# Altium schematic symbol library IC_TI.SCHLIB: 1162 symbols (part 8 of 8) (continued)
## TS3A44159PWR (continued)
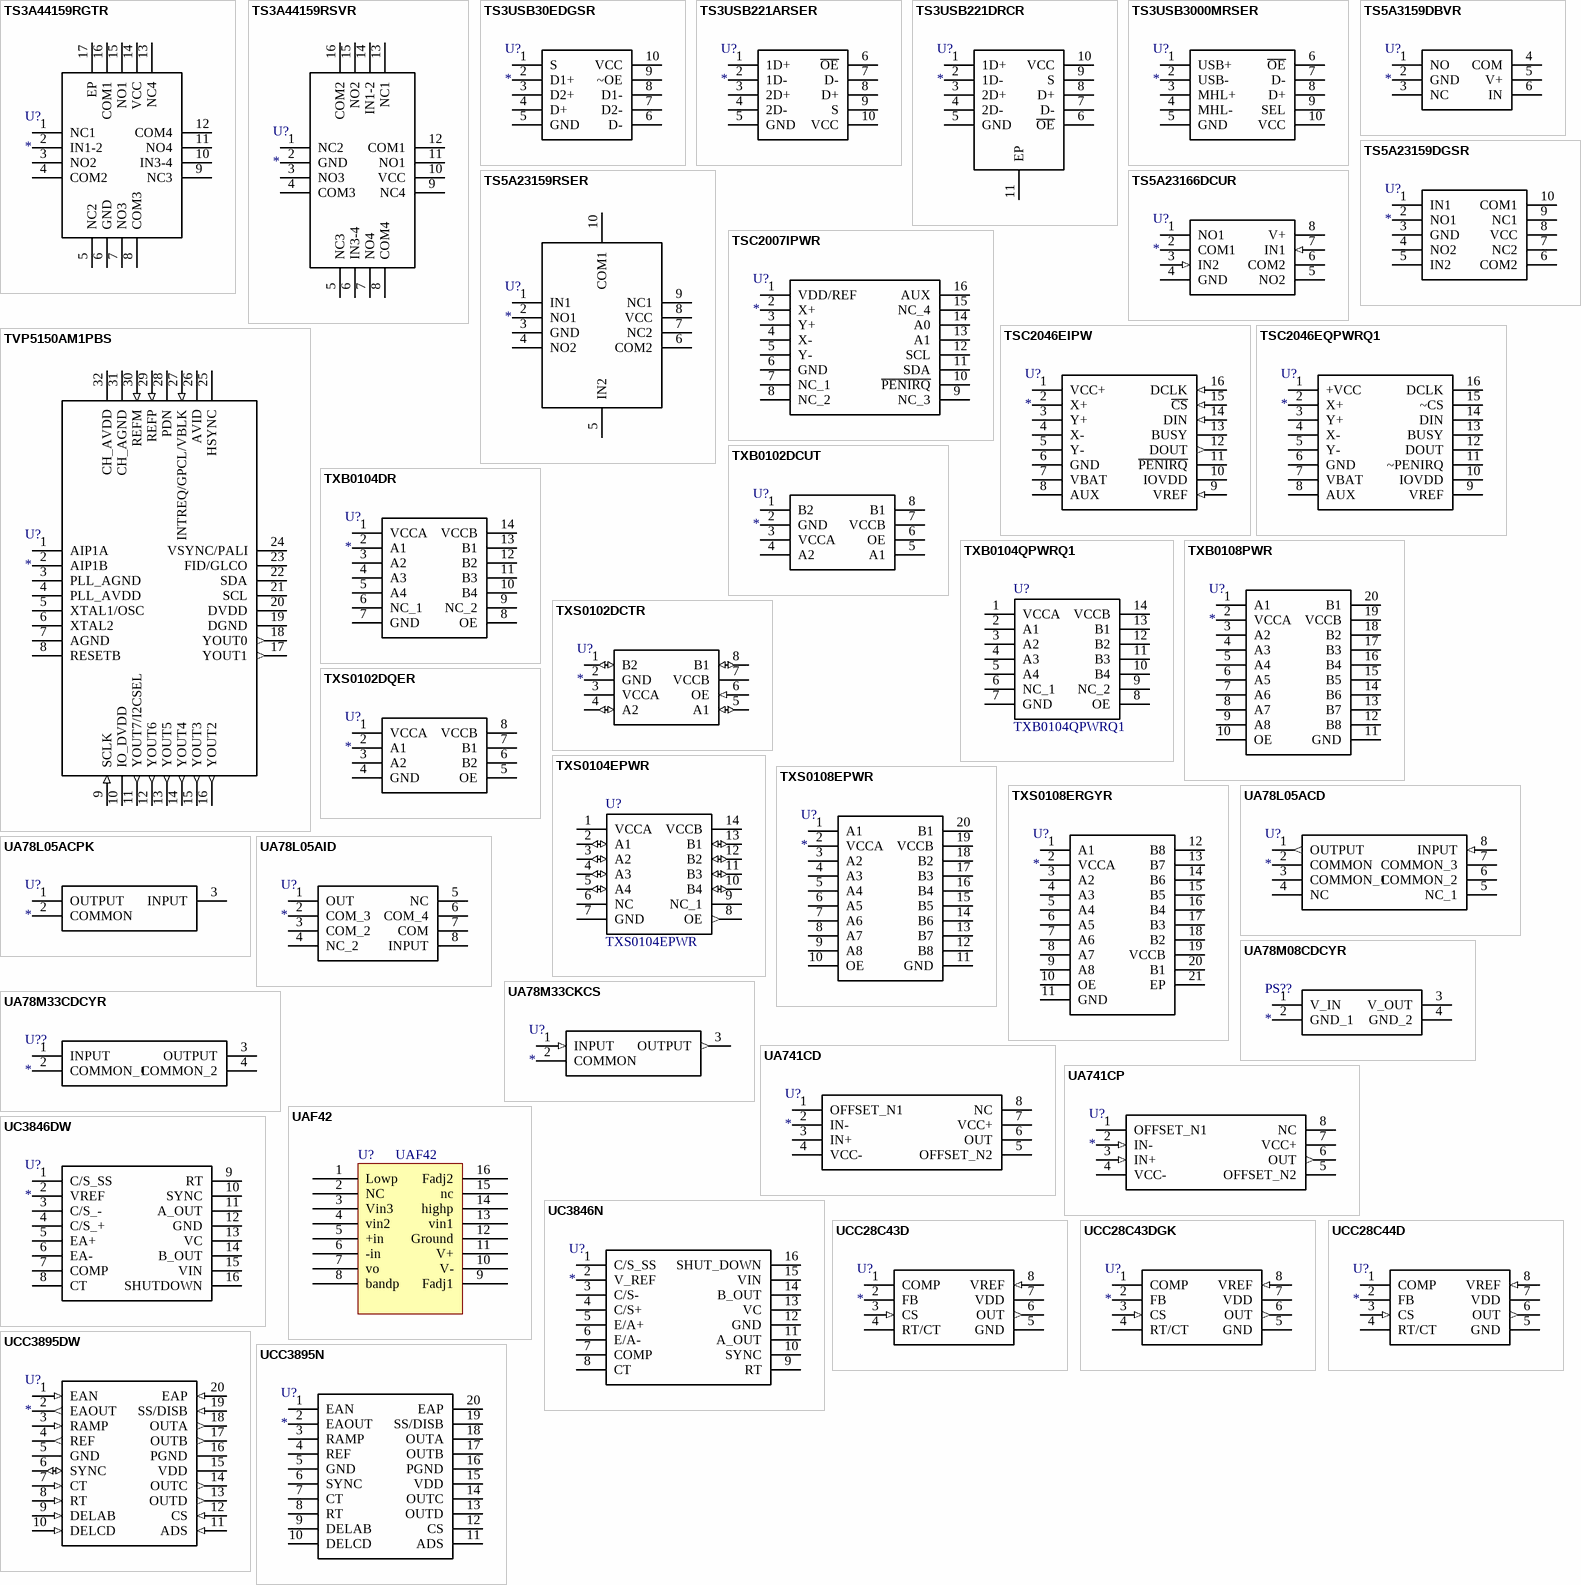
[diagram p34: symbols TS3A44159RGTR to UCC3895N]

## TS3A44159RGTR
designator U?
Integrated Circuit; Manufacturer_Name: Texas Instruments; Manufacturer_Part_Number: TS3A44159RGTR; Datasheet Link: http://www.ti.com/lit/gpn/ts3a44159; Height: 1mm; Mouser Part Number: 595-TS3A44159RGTR; Mouser Price/Stock: https://www.mouser.com/Search/Refine.aspx?Keyword=595-TS3A44159RGTR; RS Part Number: 8255387P; RS Price/Stock: http://uk.rs-online.com/web/p/products/8255387P
footprint QFN16_0.5-PAD(3X3) (QFN, 16-Leads, Body 3.0x3.0mm (max), Pitch 0.50mm, IPC Low Density)
pins: 1 NC1, 2 IN1-2, 3 NO2, 4 COM2, 5 NC2, 6 GND, 7 NO3, 8 COM3, 9 NC3, 10 IN3-4, 11 NO4, 12 COM4, 13 NC4, 14 VCC, 15 NO1, 16 COM1, 17 EP

## TS3A44159RSVR
designator U?
Integrated Circuit; Manufacturer_Name: Texas Instruments; Manufacturer_Part_Number: TS3A44159RSVR; Datasheet Link: http://www.ti.com/lit/gpn/ts3a44159; Height: 0.55mm; Mouser Part Number: 595-TS3A44159RSVR; Mouser Price/Stock: https://www.mouser.com/Search/Refine.aspx?Keyword=595-TS3A44159RSVR; RS Part Number: 1628842; RS Price/Stock: http://uk.rs-online.com/web/p/products/1628842
footprint QFN16_0.4(1.8X2.6)
pins: 1 NC2, 2 GND, 3 NO3, 4 COM3, 5 NC3, 6 IN3-4, 7 NO4, 8 COM4, 9 NC4, 10 VCC, 11 NO1, 12 COM1, 13 NC1, 14 IN1-2, 15 NO2, 16 COM2

## TS3USB30EDGSR
designator U?
Integrated Circuit; Manufacturer_Name: Texas Instruments; Manufacturer_Part_Number: TS3USB30EDGSR; Datasheet Link: http://www.ti.com/lit/gpn/ts3usb30e; Mouser Part Number: 595-TS3USB30EDGSR; Mouser Price/Stock: https://www.mouser.com/Search/Refine.aspx?Keyword=595-TS3USB30EDGSR; RS Part Number: 8175584P; RS Price/Stock: http://uk.rs-online.com/web/p/products/8175584P
footprint VSSOP10_0.5
pins: 1 S, 2 D1+, 3 D2+, 4 D+, 5 GND, 6 D-, 7 D2-, 8 D1-, 9 ~OE, 10 VCC

## TS3USB221ARSER
designator U?
Integrated Circuit; Manufacturer_Name: Texas Instruments; Manufacturer_Part_Number: TS3USB221ARSER; Datasheet Link: http://www.ti.com/lit/gpn/ts3usb221a; Mouser Part Number: 595-TS3USB221ARSER; Mouser Price/Stock: https://www.mouser.com/Search/Refine.aspx?Keyword=595-TS3USB221ARSER; RS Part Number: 1628442; RS Price/Stock: http://uk.rs-online.com/web/p/products/1628442
footprint QFN10_0.5(1.5x2)
pins: 1 1D+, 2 1D-, 3 2D+, 4 2D-, 5 GND, 6 ~{OE}, 7 D-, 8 D+, 9 S, 10 VCC

## TS3USB221DRCR
designator U?
Integrated Circuit; Manufacturer_Name: Texas Instruments; Manufacturer_Part_Number: TS3USB221DRCR; Datasheet Link: http://www.ti.com/lit/gpn/ts3usb221; Height: 1mm; Mouser Part Number: 595-TS3USB221DRCR; Mouser Price/Stock: https://www.mouser.com/Search/Refine.aspx?Keyword=595-TS3USB221DRCR; RS Part Number: 6622772P; RS Price/Stock: http://uk.rs-online.com/web/p/products/6622772P
footprint DFN10_0.5-PAD(3X3)
pins: 1 1D+, 2 1D-, 3 2D+, 4 2D-, 5 GND, 6 ~{OE}, 7 D-, 8 D+, 9 S, 10 VCC, 11 EP

## TS3USB3000MRSER
designator U?
Integrated Circuit; Manufacturer_Name: Texas Instruments; Manufacturer_Part_Number: TS3USB3000MRSER; Datasheet Link: http://www.ti.com/lit/gpn/ts3usb3000; Mouser Part Number: 595-TS3USB3000MRSER; Mouser Price/Stock: https://www.mouser.com/Search/Refine.aspx?Keyword=595-TS3USB3000MRSER
footprint QFN10_0.5(1.5x2)
pins: 1 USB+, 2 USB-, 3 MHL+, 4 MHL-, 5 GND, 6 ~{OE}, 7 D-, 8 D+, 9 SEL, 10 VCC

## TS5A3159DBVR
designator U?
Integrated Circuit; Manufacturer_Name: Texas Instruments; Manufacturer_Part_Number: TS5A3159DBVR; Datasheet Link: http://www.ti.com/lit/gpn/ts5a3159; Mouser Part Number: 595-TS5A3159DBVR; Mouser Price/Stock: https://www.mouser.com/Search/Refine.aspx?Keyword=595-TS5A3159DBVR; RS Part Number: 9224747; RS Price/Stock: http://uk.rs-online.com/web/p/products/9224747
footprint SOT23-6
pins: 1 NO, 2 GND, 3 NC, 4 COM, 5 V+, 6 IN

## TS5A23159DGSR
designator U?
Integrated Circuit; Manufacturer_Name: Texas Instruments; Manufacturer_Part_Number: TS5A23159DGSR; Datasheet Link: http://www.ti.com/lit/gpn/ts5a23159; Height: 1.1mm; Mouser Part Number: 595-TS5A23159DGSR; Mouser Price/Stock: https://www.mouser.com/Search/Refine.aspx?Keyword=595-TS5A23159DGSR
footprint VSSOP10_0.5
pins: 1 IN1, 2 NO1, 3 GND, 4 NO2, 5 IN2, 6 COM2, 7 NC2, 8 VCC, 9 NC1, 10 COM1

## TS5A23159RSER
designator U?
Integrated Circuit; Manufacturer_Name: Texas Instruments; Manufacturer_Part_Number: TS5A23159RSER; Datasheet Link: http://www.ti.com/lit/gpn/ts5a23159; Height: 0.6mm; Mouser Part Number: 595-TS5A23159RSER; Mouser Price/Stock: https://www.mouser.com/Search/Refine.aspx?Keyword=595-TS5A23159RSER; RS Part Number: 8255438; RS Price/Stock: http://uk.rs-online.com/web/p/products/8255438
footprint QFN10_0.5(1.5x2)
pins: 1 IN1, 2 NO1, 3 GND, 4 NO2, 5 IN2, 6 COM2, 7 NC2, 8 VCC, 9 NC1, 10 COM1

## TS5A23166DCUR
designator U?
Integrated Circuit; Manufacturer_Name: Texas Instruments; Manufacturer_Part_Number: TS5A23166DCUR; Datasheet Link: http://www.ti.com/lit/ds/symlink/ts5a23166.pdf; Height: 0.9mm; Mouser Part Number: 595-TS5A23166DCUR; Mouser Price/Stock: https://www.mouser.com/Search/Refine.aspx?Keyword=595-TS5A23166DCUR; RS Part Number: 1624929; RS Price/Stock: http://uk.rs-online.com/web/p/products/1624929
footprint VSSOP8_0.5(3X2)
pins: 1 NO1, 2 COM1, 3 IN2 (in), 4 GND (power), 5 NO2, 6 COM2, 7 IN1 (in), 8 V+

## TSC2007IPWR
designator U?
Integrated Circuit; Manufacturer_Name: Texas Instruments; Manufacturer_Part_Number: TSC2007IPWR; Datasheet Link: http://www.ti.com/lit/ds/symlink/tsc2007.pdf; Height: 1.2mm; Mouser Part Number: 595-TSC2007IPWR; Mouser Price/Stock: https://www.mouser.com/Search/Refine.aspx?Keyword=595-TSC2007IPWR
footprint TSSOP16_0.65 (Shrink Small Outline; 16 Leads; Body Width 4.4 mm; Pitch 0.65 mm)
pins: 1 VDD/REF, 2 X+, 3 Y+, 4 X-, 5 Y-, 6 GND, 7 NC_1, 8 NC_2, 9 NC_3, 10 ~{PENIRQ}, 11 SDA, 12 SCL, 13 A1, 14 A0, 15 NC_4, 16 AUX

## TSC2046EIPW
designator U?
Integrated Circuit; Manufacturer_Name: Texas Instruments; Manufacturer_Part_Number: TSC2046EIPW; Datasheet Link: http://docs-emea.rs-online.com/webdocs/0afe/0900766b80afed4b.pdf; Height: 1.2mm; Mouser Part Number: 595-TSC2046EIPW; Mouser Price/Stock: https://www.mouser.com/Search/Refine.aspx?Keyword=595-TSC2046EIPW; RS Part Number: 0459516P; RS Price/Stock: http://uk.rs-online.com/web/p/products/0459516P
footprint TSSOP16_0.65 (Shrink Small Outline; 16 Leads; Body Width 4.4 mm; Pitch 0.65 mm)
pins: 1 VCC+ (power), 2 X+, 3 Y+, 4 X-, 5 Y-, 6 GND (power), 7 VBAT, 8 AUX, 9 VREF (in), 10 IOVDD (power), 11 ~{PENIRQ}, 12 DOUT (out), 13 BUSY, 14 DIN (in), 15 ~{CS} (in), 16 DCLK (in)

## TSC2046EQPWRQ1
designator U?
Integrated Circuit; Manufacturer_Name: Texas Instruments; Manufacturer_Part_Number: TSC2046EQPWRQ1; Datasheet Link: http://www.ti.com/lit/gpn/tsc2046e-q1; Mouser Part Number: 595-TSC2046EQPWRQ1; Mouser Price/Stock: https://www.mouser.com/Search/Refine.aspx?Keyword=595-TSC2046EQPWRQ1
footprint TSSOP16_0.65 (Shrink Small Outline; 16 Leads; Body Width 4.4 mm; Pitch 0.65 mm)
pins: 1 +VCC, 2 X+, 3 Y+, 4 X-, 5 Y-, 6 GND, 7 VBAT, 8 AUX, 9 VREF, 10 IOVDD, 11 ~PENIRQ, 12 DOUT, 13 BUSY, 14 DIN, 15 ~CS, 16 DCLK

## TVP5150AM1PBS
designator U?
Integrated Circuit; Manufacturer_Name: Texas Instruments; Manufacturer_Part_Number: TVP5150AM1PBS; Datasheet Link: http://www.ti.com/lit/ds/symlink/tvp5150am1.pdf; Height: 1.2mm; Mouser Part Number: 595-TVP5150AM1PBS; Mouser Price/Stock: https://www.mouser.com/Search/Refine.aspx?Keyword=595-TVP5150AM1PBS; RS Part Number: 1624933; RS Price/Stock: http://uk.rs-online.com/web/p/products/1624933
footprint LQFP32_0.5mm
pins: 1 AIP1A, 2 AIP1B, 3 PLL_AGND (power), 4 PLL_AVDD (power), 5 XTAL1/OSC, 6 XTAL2, 7 AGND (power), 8 RESETB, 9 SCLK (in), 10 IO_DVDD (power), 11 YOUT7/I2CSEL (out), 12 YOUT6 (out), 13 YOUT5 (out), 14 YOUT4 (out), 15 YOUT3 (out), 16 YOUT2 (out), 17 YOUT1 (out), 18 YOUT0 (out), 19 DGND (power), 20 DVDD (power), 21 SCL, 22 SDA, 23 FID/GLCO, 24 VSYNC/PALI, 25 HSYNC, 26 AVID, 27 INTREQ/GPCL/VBLK (in), 28 PDN, 29 REFP (in), 30 REFM (in), 31 CH_AGND (power), 32 CH_AVDD (power)

## TXB0102DCUT
designator U?
Integrated Circuit; Manufacturer_Name: Texas Instruments; Manufacturer_Part_Number: TXB0102DCUT; Datasheet Link: http://www.ti.com/lit/ds/symlink/txb0102.pdf; Height: 0.9mm; Mouser Part Number: 595-TXB0102DCUT; Mouser Price/Stock: https://www.mouser.com/Search/Refine.aspx?Keyword=595-TXB0102DCUT; RS Part Number: 7099022P; RS Price/Stock: http://uk.rs-online.com/web/p/products/7099022P
footprint VSSOP8_0.5(3X2)
pins: 1 B2, 2 GND (power), 3 VCCA (power), 4 A2, 5 A1, 6 OE, 7 VCCB (power), 8 B1

## TXB0104DR
designator U?
Integrated Circuit; Manufacturer_Name: Texas Instruments; Manufacturer_Part_Number: TXB0104DR; Datasheet Link: http://www.ti.com/lit/gpn/txb0104; Height: 1.75mm; Mouser Part Number: 595-TXB0104DR; Mouser Price/Stock: https://www.mouser.com/Search/Refine.aspx?Keyword=595-TXB0104DR
footprint SOIC14_1.27
pins: 1 VCCA, 2 A1, 3 A2, 4 A3, 5 A4, 6 NC_1, 7 GND, 8 OE, 9 NC_2, 10 B4, 11 B3, 12 B2, 13 B1, 14 VCCB

## TXB0104QPWRQ1
designator U?
Integrated Circuit; Manufacturer_Name: Texas Instruments; Datasheet Link: http://www.ti.com/lit/gpn/txb0104-q1; Height: 1.2mm; Manufacturer_Part_Number: TXB0104QPWRQ1; Mouser Part Number: 595-TXB0104QPWRQ1; Mouser Price/Stock: https://www.mouser.com/Search/Refine.aspx?Keyword=595-TXB0104QPWRQ1
footprint TSSOP14_0.65 (TSOP, 14-Leads, Body 5.00x4.40mm, Pitch 0.65mm, Thermal Pad 2.31x2.46mm, IPC Low Density)
pins: 1 VCCA, 2 A1, 3 A2, 4 A3, 5 A4, 6 NC_1, 7 GND, 8 OE, 9 NC_2, 10 B4, 11 B3, 12 B2, 13 B1, 14 VCCB

## TXB0108PWR
designator U?
Integrated Circuit; Manufacturer_Name: Texas Instruments; Manufacturer_Part_Number: TXB0108PWR; Datasheet Link: http://www.ti.com/lit/ds/symlink/txb0108.pdf; Height: 1.2mm; Mouser Part Number: 595-TXB0108PWR; Mouser Price/Stock: https://www.mouser.com/Search/Refine.aspx?Keyword=595-TXB0108PWR; RS Part Number: 7094614P; RS Price/Stock: http://uk.rs-online.com/web/p/products/7094614P
footprint TSSOP20_0.65 (TSOP, 20-Leads, Body 6.6x4.5mm (max), Pitch 0.65mm, IPC Medium Density)
pins: 1 A1, 2 VCCA (power), 3 A2, 4 A3, 5 A4, 6 A5, 7 A6, 8 A7, 9 A8, 10 OE, 11 GND (power), 12 B8, 13 B7, 14 B6, 15 B5, 16 B4, 17 B3, 18 B2, 19 VCCB (power), 20 B1

## TXS0102DCTR
designator U?
Integrated Circuit; Manufacturer_Name: Texas Instruments; Manufacturer_Part_Number: TXS0102DCTR; Datasheet Link: http://www.ti.com/lit/gpn/txs0102; Height: 1.3mm; Mouser Part Number: 595-TXS0102DCTR; Mouser Price/Stock: https://www.mouser.com/Search/Refine.aspx?Keyword=595-TXS0102DCTR; RS Part Number: 1628462; RS Price/Stock: http://uk.rs-online.com/web/p/products/1628462
footprint VSSOP8_0.65(4X3)
pins: 1 B2 (io), 2 GND (power), 3 VCCA (power), 4 A2 (io), 5 A1 (io), 6 OE (in), 7 VCCB (power), 8 B1 (io)

## TXS0102DQER
designator U?
Integrated Circuit; Manufacturer_Name: Texas Instruments; Manufacturer_Part_Number: TXS0102DQER; Datasheet Link: http://www.ti.com/lit/gpn/txs0102; Height: 0.4mm; Mouser Part Number: 595-TXS0102DQER; Mouser Price/Stock: https://www.mouser.com/Search/Refine.aspx?Keyword=595-TXS0102DQER; RS Part Number: 8255450P; RS Price/Stock: http://uk.rs-online.com/web/p/products/8255450P
footprint DFN8_0.35(1.4X1)
pins: 1 VCCA, 2 A1, 3 A2, 4 GND, 5 OE, 6 B2, 7 B1, 8 VCCB

## TXS0104EPWR
designator U?
Integrated Circuit; Manufacturer_Name: Texas Instruments; Datasheet Link: http://www.ti.com/lit/ds/symlink/txs0104e.pdf; Height: 1.2mm; Manufacturer_Part_Number: TXS0104EPWR; Mouser Part Number: 595-TXS0104EPWR; Mouser Price/Stock: https://www.mouser.com/Search/Refine.aspx?Keyword=595-TXS0104EPWR; RS Part Number: 9215065; RS Price/Stock: http://uk.rs-online.com/web/p/products/9215065
footprint TSSOP14_0.65 (TSOP, 14-Leads, Body 5.00x4.40mm, Pitch 0.65mm, Thermal Pad 2.31x2.46mm, IPC Low Density)
pins: 1 VCCA (power), 2 A1 (io), 3 A2 (io), 4 A3 (io), 5 A4 (io), 6 NC, 7 GND (power), 8 OE (out), 9 NC_1, 10 B4 (io), 11 B3 (io), 12 B2 (io), 13 B1 (io), 14 VCCB (power)

## TXS0108EPWR
designator U?
Integrated Circuit; Manufacturer_Name: Texas Instruments; Manufacturer_Part_Number: TXS0108EPWR; Datasheet Link: http://www.ti.com/lit/ds/symlink/txs0108e.pdf; Height: 1.2mm; Mouser Part Number: 595-TXS0108EPWR; Mouser Price/Stock: https://www.mouser.com/Search/Refine.aspx?Keyword=595-TXS0108EPWR; RS Part Number: 9236949; RS Price/Stock: http://uk.rs-online.com/web/p/products/9236949
footprint TSSOP20_0.65 (TSOP, 20-Leads, Body 6.6x4.5mm (max), Pitch 0.65mm, IPC Medium Density)
pins: 1 A1, 2 VCCA, 3 A2, 4 A3, 5 A4, 6 A5, 7 A6, 8 A7, 9 A8, 10 OE, 11 GND, 12 B8, 13 B7, 14 B6, 15 B5, 16 B4, 17 B3, 18 B2, 19 VCCB, 20 B1

## TXS0108ERGYR
designator U?
Integrated Circuit; Manufacturer_Name: Texas Instruments; Manufacturer_Part_Number: TXS0108ERGYR; Datasheet Link: http://www.ti.com/lit/gpn/txs0108e; Height: 1mm; Mouser Part Number: 595-TXS0108ERGYR; Mouser Price/Stock: https://www.mouser.com/Search/Refine.aspx?Keyword=595-TXS0108ERGYR
footprint QFN20_0.5-PAD(4.5X3.5)
pins: 1 A1, 2 VCCA, 3 A2, 4 A3, 5 A4, 6 A5, 7 A6, 8 A7, 9 A8, 10 OE, 11 GND, 12 B8, 13 B7, 14 B6, 15 B5, 16 B4, 17 B3, 18 B2, 19 VCCB, 20 B1, 21 EP

## UA78L05ACD
designator U?
Integrated Circuit; Manufacturer_Name: Texas Instruments; Manufacturer_Part_Number: UA78L05ACD; Datasheet Link: http://www.ti.com/lit/ds/symlink/ua78l05a.pdf; Height: 1.75mm; Mouser Part Number: 595-UA78L05ACD; Mouser Price/Stock: https://www.mouser.com/Search/Refine.aspx?Keyword=595-UA78L05ACD; RS Part Number: 9223518; RS Price/Stock: http://uk.rs-online.com/web/p/products/9223518
footprint SOIC8_1.27 (SOP, 8-Leads, Pitch 1.27mm)
pins: 1 OUTPUT (out), 2 COMMON, 3 COMMON_1, 4 NC, 5 NC_1, 6 COMMON_2, 7 COMMON_3, 8 INPUT (in)

## UA78L05ACPK
designator U?
Integrated Circuit; Manufacturer_Name: Texas Instruments; Manufacturer_Part_Number: UA78L05ACPK; Datasheet Link: http://www.ti.com/lit/gpn/ua78l; Mouser Part Number: 595-UA78L05ACPK; Mouser Price/Stock: https://www.mouser.com/Search/Refine.aspx?Keyword=595-UA78L05ACPK
footprint SOT89
pins: 1 OUTPUT, 2 COMMON, 3 INPUT

## UA78L05AID
designator U?
Integrated Circuit; Manufacturer_Name: Texas Instruments; Manufacturer_Part_Number: UA78L05AID; Mouser Part Number: 595-UA78L05AID; Mouser Price/Stock: https://www.mouser.com/Search/Refine.aspx?Keyword=595-UA78L05AID; RS Part Number: 1449921; RS Price/Stock: http://uk.rs-online.com/web/p/products/1449921
footprint SOIC8_1.27 (SOP, 8-Leads, Pitch 1.27mm)
pins: 1 OUT, 2 COM_3, 3 COM_2, 4 NC_2, 5 NC, 6 COM_4, 7 COM, 8 INPUT

## UA78M08CDCYR
designator PS??
Power Supply; Manufacturer_Name: Texas Instruments; Manufacturer_Part_Number: UA78M08CDCYR; Datasheet Link: http://www.ti.com/lit/gpn/ua78m; Height: 1.8mm; Mouser Part Number: 595-UA78M08CDCYR; Mouser Price/Stock: https://www.mouser.com/Search/Refine.aspx?Keyword=595-UA78M08CDCYR
footprint SOT223
pins: 1 V_IN (power), 2 GND_1 (power), 3 V_OUT (power), 4 GND_2 (power)

## UA78M33CDCYR
designator U??
Undefined or Miscellaneous; Manufacturer_Name: Texas Instruments; Manufacturer_Part_Number: UA78M33CDCYR; Datasheet Link: http://www.ti.com/lit/gpn/ua78m; Height: 1.8mm; Mouser Part Number: 595-UA78M33CDCYR; Mouser Price/Stock: https://www.mouser.com/Search/Refine.aspx?Keyword=595-UA78M33CDCYR
footprint SOT223
pins: 1 INPUT, 2 COMMON_1, 3 OUTPUT, 4 COMMON_2

## UA78M33CKCS
designator U?
Integrated Circuit; Manufacturer_Name: Texas Instruments; Manufacturer_Part_Number: UA78M33CKCS; Datasheet Link: http://docs-emea.rs-online.com/webdocs/0c9c/0900766b80c9c904.pdf; Height: 4.7mm; Mouser Part Number: 595-UA78M33CKCS; Mouser Price/Stock: https://www.mouser.com/Search/Refine.aspx?Keyword=595-UA78M33CKCS; RS Part Number: 6616737P; RS Price/Stock: http://uk.rs-online.com/web/p/products/6616737P
footprint TO220-3
pins: 1 INPUT (in), 2 COMMON, 3 OUTPUT (out)

## UA741CD
designator U?
Integrated Circuit; Manufacturer_Name: Texas Instruments; Manufacturer_Part_Number: UA741CD; Datasheet Link: http://www.ti.com/lit/ds/symlink/ua741.pdf; Height: 1.75mm; Mouser Part Number: 595-UA741CD; Mouser Price/Stock: https://www.mouser.com/Search/Refine.aspx?Keyword=595-UA741CD; RS Part Number: 1791630; RS Price/Stock: http://uk.rs-online.com/web/p/products/1791630
footprint SOIC8_1.27 (SOP, 8-Leads, Pitch 1.27mm)
pins: 1 OFFSET_N1, 2 IN-, 3 IN+, 4 VCC-, 5 OFFSET_N2, 6 OUT, 7 VCC+, 8 NC

## UA741CP
designator U?
Integrated Circuit; Manufacturer_Name: Texas Instruments; Manufacturer_Part_Number: UA741CP; Datasheet Link: http://www.ti.com/lit/ds/symlink/ua741.pdf; Height: 5.08mm; Mouser Part Number: 595-UA741CP; Mouser Price/Stock: https://www.mouser.com/Search/Refine.aspx?Keyword=595-UA741CP; RS Part Number: 0305311P; RS Price/Stock: http://uk.rs-online.com/web/p/products/0305311P
footprint DIP8-A
pins: 1 OFFSET_N1, 2 IN- (in), 3 IN+ (in), 4 VCC- (power), 5 OFFSET_N2, 6 OUT (out), 7 VCC+ (power), 8 NC

## UAF42
designator U?
footprint SOIC16W_1.27
pins: 1 Lowp, 2 NC, 3 Vin3, 4 vin2, 5 +in, 6 -in, 7 vo, 8 bandp, 9 Fadj1, 10 V-, 11 V+, 12 Ground, 13 vin1, 14 highp, 15 nc, 16 Fadj2

## UC3846DW
designator U?
Integrated Circuit; Manufacturer_Name: Texas Instruments; Manufacturer_Part_Number: UC3846DW; Datasheet Link: http://www.ti.com/lit/gpn/uc3846; Mouser Part Number: 595-UC3846DW; Mouser Price/Stock: https://www.mouser.com/Search/Refine.aspx?Keyword=595-UC3846DW; RS Part Number: 1626053; RS Price/Stock: http://uk.rs-online.com/web/p/products/1626053
footprint SOIC16W_1.27
pins: 1 C/S_SS, 2 VREF, 3 C/S_-, 4 C/S_+, 5 EA+, 6 EA-, 7 COMP, 8 CT, 9 RT, 10 SYNC, 11 A_OUT, 12 GND, 13 VC, 14 B_OUT, 15 VIN, 16 SHUTDOWN

## UC3846N
designator U?
Integrated Circuit; Manufacturer_Name: Texas Instruments; Manufacturer_Part_Number: UC3846N; Datasheet Link: http://componentsearchengine.com/Datasheets/1/UC3846N.pdf; Mouser Part Number: 595-UC3846N; Mouser Price/Stock: https://www.mouser.com/Search/Refine.aspx?Keyword=595-UC3846N; RS Part Number: 1218957; RS Price/Stock: http://uk.rs-online.com/web/p/products/1218957
footprint DIP16
pins: 1 C/S_SS, 2 V_REF, 3 C/S-, 4 C/S+, 5 E/A+, 6 E/A-, 7 COMP, 8 CT, 9 RT, 10 SYNC, 11 A_OUT, 12 GND, 13 VC, 14 B_OUT, 15 VIN, 16 SHUT_DOWN

## UCC28C43D
designator U?
Integrated Circuit; Manufacturer_Name: Texas Instruments; Manufacturer_Part_Number: UCC28C43D; Datasheet Link: http://www.ti.com/lit/ds/symlink/ucc28c43.pdf; Height: 1.75mm; Mouser Part Number: 595-UCC28C43D; Mouser Price/Stock: https://www.mouser.com/Search/Refine.aspx?Keyword=595-UCC28C43D; RS Part Number: 6282393P; RS Price/Stock: http://befr.rs-online.com/web/p/products/6282393P
footprint SOIC8_1.27 (SOP, 8-Leads, Pitch 1.27mm)
pins: 1 COMP, 2 FB, 3 CS (in), 4 RT/CT, 5 GND (power), 6 OUT (out), 7 VDD (power), 8 VREF (in)

## UCC28C43DGK
designator U?
Integrated Circuit; Manufacturer_Name: Texas Instruments; Manufacturer_Part_Number: UCC28C43DGK; Datasheet Link: http://www.ti.com/lit/ds/symlink/ucc28c43.pdf; Height: 1.1mm; Mouser Part Number: 595-UCC28C43DGK; Mouser Price/Stock: https://www.mouser.com/Search/Refine.aspx?Keyword=595-UCC28C43DGK; RS Part Number: 6282832P; RS Price/Stock: http://befr.rs-online.com/web/p/products/6282832P
footprint VSSOP8_0.65-PAD
pins: 1 COMP, 2 FB, 3 CS (in), 4 RT/CT, 5 GND (power), 6 OUT (out), 7 VDD (power), 8 VREF (in)

## UCC28C44D
designator U?
Integrated Circuit; Manufacturer_Name: Texas Instruments; Manufacturer_Part_Number: UCC28C44D; Datasheet Link: http://www.ti.com/lit/ds/symlink/ucc28c43.pdf; Height: 1.75mm; RS Part Number: 6282804; RS Price/Stock: http://uk.rs-online.com/web/p/pwm-current-mode-controllers/6282804/?source=DS
footprint SOIC8_1.27 (SOP, 8-Leads, Pitch 1.27mm)
pins: 1 COMP, 2 FB, 3 CS (in), 4 RT/CT, 5 GND (power), 6 OUT (out), 7 VDD (power), 8 VREF (in)

## UCC3895DW
designator U?
Integrated Circuit; Manufacturer_Name: Texas Instruments; Manufacturer_Part_Number: UCC3895DW; Datasheet Link: http://www.ti.com/lit/ds/symlink/ucc3895.pdf; Height: 2.65mm; Mouser Part Number: 595-UCC3895DW; Mouser Price/Stock: https://www.mouser.com/Search/Refine.aspx?Keyword=595-UCC3895DW; RS Part Number: 9223489; RS Price/Stock: http://uk.rs-online.com/web/p/products/9223489
footprint SOIC20W_1.27
pins: 1 EAN (in), 2 EAOUT (out), 3 RAMP (in), 4 REF (out), 5 GND (power), 6 SYNC (io), 7 CT (in), 8 RT (in), 9 DELAB (in), 10 DELCD (in), 11 ADS (in), 12 CS (in), 13 OUTD (out), 14 OUTC (out), 15 VDD (power), 16 PGND (power), 17 OUTB (out), 18 OUTA (out), 19 SS/DISB (in), 20 EAP (in)

## UCC3895N
designator U?
Integrated Circuit; Manufacturer_Name: Texas Instruments; Manufacturer_Part_Number: UCC3895N; Datasheet Link: http://www.ti.com/lit/gpn/ucc3895; Mouser Part Number: 595-UCC3895N; Mouser Price/Stock: https://www.mouser.com/Search/Refine.aspx?Keyword=595-UCC3895N; RS Part Number: 9223498; RS Price/Stock: http://uk.rs-online.com/web/p/products/9223498
footprint DIP20
pins: 1 EAN, 2 EAOUT, 3 RAMP, 4 REF, 5 GND, 6 SYNC, 7 CT, 8 RT, 9 DELAB, 10 DELCD, 11 ADS, 12 CS, 13 OUTD, 14 OUTC, 15 VDD, 16 PGND, 17 OUTB, 18 OUTA, 19 SS/DISB, 20 EAP

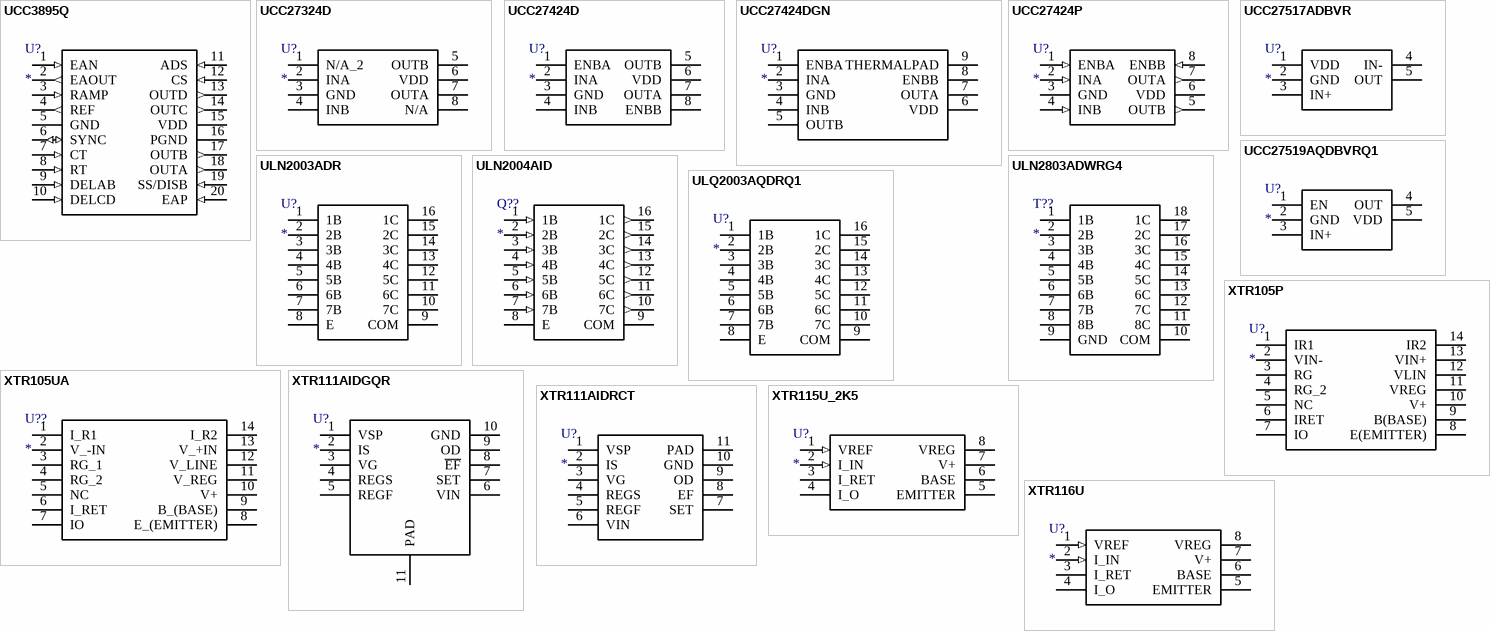
[diagram p35: symbols UCC3895Q to XTR116U]

## UCC3895Q
designator U?
Integrated Circuit; Manufacturer_Name: Texas Instruments; Manufacturer_Part_Number: UCC3895Q; Datasheet Link: http://www.ti.com/lit/ds/symlink/ucc3895.pdf; Height: 4.57mm; Mouser Part Number: 595-UCC3895Q; Mouser Price/Stock: https://www.mouser.com/Search/Refine.aspx?Keyword=595-UCC3895Q; RS Part Number: 6616077; RS Price/Stock: http://uk.rs-online.com/web/p/pwm-soft-switching-controllers/6616077/?source=DS
footprint PLCC-20N (PLCC, 44-Leads, Body 17.6x17.6mm (max), Pitch 1.270mm, IPC Medium Density)
pins: 1 EAN (in), 2 EAOUT (out), 3 RAMP (in), 4 REF (out), 5 GND (power), 6 SYNC (io), 7 CT (in), 8 RT (in), 9 DELAB (in), 10 DELCD (in), 11 ADS (in), 12 CS (in), 13 OUTD (out), 14 OUTC (out), 15 VDD (power), 16 PGND (power), 17 OUTB (out), 18 OUTA (out), 19 SS/DISB (in), 20 EAP (in)

## UCC27324D
designator U?
Integrated Circuit; Manufacturer_Name: Texas Instruments; Manufacturer_Part_Number: UCC27324D; Datasheet Link: http://www.ti.com/lit/gpn/ucc27324; Mouser Part Number: 595-UCC27324D; Mouser Price/Stock: https://www.mouser.com/Search/Refine.aspx?Keyword=595-UCC27324D; RS Part Number: 6613182P; RS Price/Stock: http://uk.rs-online.com/web/p/products/6613182P
footprint SOIC8_1.27 (SOP, 8-Leads, Pitch 1.27mm)
pins: 1 N/A_2, 2 INA, 3 GND, 4 INB, 5 OUTB, 6 VDD, 7 OUTA, 8 N/A

## UCC27424D
designator U?
Integrated Circuit; Manufacturer_Name: Texas Instruments; Manufacturer_Part_Number: UCC27424D; Datasheet Link: http://www.ti.com/lit/gpn/ucc27424; Mouser Part Number: 595-UCC27424D; Mouser Price/Stock: https://www.mouser.com/Search/Refine.aspx?Keyword=595-UCC27424D; RS Part Number: 9223316; RS Price/Stock: http://uk.rs-online.com/web/p/products/9223316
footprint SOIC8_1.27 (SOP, 8-Leads, Pitch 1.27mm)
pins: 1 ENBA, 2 INA, 3 GND, 4 INB, 5 OUTB, 6 VDD, 7 OUTA, 8 ENBB

## UCC27424DGN
designator U?
Integrated Circuit; Manufacturer_Name: Texas Instruments; Manufacturer_Part_Number: UCC27424DGN; Datasheet Link: http://www.ti.com/lit/gpn/ucc27424; Mouser Part Number: 595-UCC27424DGN; Mouser Price/Stock: https://www.mouser.com/Search/Refine.aspx?Keyword=595-UCC27424DGN; RS Part Number: 1625660; RS Price/Stock: http://uk.rs-online.com/web/p/products/1625660
footprint VSSOP8_0.65-PAD
pins: 1 ENBA, 2 INA, 3 GND, 4 INB, 5 OUTB, 6 VDD, 7 OUTA, 8 ENBB, 9 THERMALPAD

## UCC27424P
designator U?
Integrated Circuit; Manufacturer_Name: Texas Instruments; Manufacturer_Part_Number: UCC27424P; Datasheet Link: http://www.ti.com/lit/ds/symlink/ucc27423.pdf; Height: 5.08mm; Mouser Part Number: 595-UCC27424P; Mouser Price/Stock: https://www.mouser.com/Search/Refine.aspx?Keyword=595-UCC27424P; RS Part Number: 1457074; RS Price/Stock: http://uk.rs-online.com/web/p/products/1457074
footprint DIP8-A
pins: 1 ENBA (in), 2 INA (in), 3 GND (power), 4 INB (in), 5 OUTB (out), 6 VDD (power), 7 OUTA (out), 8 ENBB (in)

## UCC27517ADBVR
designator U?
Integrated Circuit; Manufacturer_Name: Texas Instruments; Manufacturer_Part_Number: UCC27517ADBVR; Datasheet Link: http://www.ti.com/lit/gpn/ucc27517a; Height: 1.45mm; Mouser Part Number: 595-UCC27517ADBVR; Mouser Price/Stock: https://www.mouser.com/Search/Refine.aspx?Keyword=595-UCC27517ADBVR
footprint SOT23-5 (SOT23, 5-Leads, Body 3.0x3.0mm (max), Pitch 0.95mm, IPC Medium Density)
pins: 1 VDD, 2 GND, 3 IN+, 4 IN-, 5 OUT

## UCC27519AQDBVRQ1
designator U?
Integrated Circuit; Manufacturer_Name: Texas Instruments; Manufacturer_Part_Number: UCC27519AQDBVRQ1; Datasheet Link: http://www.ti.com/lit/gpn/ucc27519a-q1; Height: 1.45mm; Mouser Part Number: 595-UCC27519AQDBVRQ1; Mouser Price/Stock: https://www.mouser.com/Search/Refine.aspx?Keyword=595-UCC27519AQDBVRQ1
footprint SOT23-5 (SOT23, 5-Leads, Body 3.0x3.0mm (max), Pitch 0.95mm, IPC Medium Density)
pins: 1 EN, 2 GND, 3 IN+, 4 OUT, 5 VDD

## ULN2003ADR
designator U?
Integrated Circuit; Manufacturer_Name: Texas Instruments; Manufacturer_Part_Number: ULN2003ADR; Datasheet Link: http://www.ti.com/lit/ds/symlink/uln2003a.pdf; Height: 1.75mm; Mouser Part Number: 595-ULN2003ADR; Mouser Price/Stock: https://www.mouser.com/Search/Refine.aspx?Keyword=595-ULN2003ADR; RS Part Number: 6658699P; RS Price/Stock: http://uk.rs-online.com/web/p/products/6658699P
footprint SOIC16_1.27
pins: 1 1B, 2 2B, 3 3B, 4 4B, 5 5B, 6 6B, 7 7B, 8 E, 9 COM, 10 7C, 11 6C, 12 5C, 13 4C, 14 3C, 15 2C, 16 1C

## ULN2004AID
designator Q??
Transistor; Manufacturer_Name: Texas Instruments; Manufacturer_Part_Number: ULN2004AID; Datasheet Link: http://www.ti.com/lit/ds/symlink/uln2004ai.pdf; Height: 1.75mm; Mouser Part Number: 595-ULN2004AID; Mouser Price/Stock: https://www.mouser.com/Search/Refine.aspx?Keyword=595-ULN2004AID; RS Part Number: 6659194P; RS Price/Stock: http://uk.rs-online.com/web/p/products/6659194P
footprint SOIC16_1.27
pins: 1 1B (in), 2 2B (in), 3 3B (in), 4 4B (in), 5 5B (in), 6 6B (in), 7 7B (in), 8 E (power), 9 COM (power), 10 7C (out), 11 6C (out), 12 5C (out), 13 4C (out), 14 3C (out), 15 2C (out), 16 1C (out)

## ULN2803ADWRG4
designator T??
Transformer; Manufacturer_Name: Texas Instruments; Manufacturer_Part_Number: ULN2803ADWRG4; Datasheet Link: http://www.ti.com/lit/ds/symlink/uln2803a.pdf; Height: 2.65mm; Mouser Part Number: 595-ULN2803ADWRG4; Mouser Price/Stock: https://www.mouser.com/Search/Refine.aspx?Keyword=595-ULN2803ADWRG4
footprint SOIC18W_1.27 (SOIC, 18-Leads, Body 11.5x7.5mm, Pitch 1.27mm, IPC Medium Density)
pins: 1 1B, 2 2B, 3 3B, 4 4B, 5 5B, 6 6B, 7 7B, 8 8B, 9 GND, 10 COM, 11 8C, 12 7C, 13 6C, 14 5C, 15 4C, 16 3C, 17 2C, 18 1C

## ULQ2003AQDRQ1
designator U?
Integrated Circuit; Manufacturer_Name: Texas Instruments; Manufacturer_Part_Number: ULQ2003AQDRQ1; Datasheet Link: http://www.farnell.com/datasheets/1942439.pdf; Height: 1.75mm; Mouser Part Number: 595-ULQ2003AQDRQ1; Mouser Price/Stock: https://www.mouser.com/Search/Refine.aspx?Keyword=595-ULQ2003AQDRQ1
footprint SOIC16_1.27
pins: 1 1B, 2 2B, 3 3B, 4 4B, 5 5B, 6 6B, 7 7B, 8 E, 9 COM, 10 7C, 11 6C, 12 5C, 13 4C, 14 3C, 15 2C, 16 1C

## XTR105P
designator U?
Integrated Circuit; Manufacturer_Name: Texas Instruments; Manufacturer_Part_Number: XTR105P; Datasheet Link: http://www.ti.com/lit/gpn/xtr105; Mouser Part Number: 595-XTR105P; Mouser Price/Stock: https://www.mouser.com/Search/Refine.aspx?Keyword=595-XTR105P; RS Part Number: 3071796; RS Price/Stock: http://uk.rs-online.com/web/p/products/3071796
footprint DIP14
pins: 1 IR1, 2 VIN-, 3 RG, 4 RG_2, 5 NC, 6 IRET, 7 IO, 8 E(EMITTER), 9 B(BASE), 10 V+, 11 VREG, 12 VLIN, 13 VIN+, 14 IR2

## XTR105UA
designator U??
Undefined or Miscellaneous; Manufacturer_Name: Texas Instruments; Manufacturer_Part_Number: XTR105UA; Datasheet Link: http://www.ti.com/lit/ds/symlink/xtr105.pdf; Height: 1.75mm; Mouser Part Number: 595-XTR105UA; Mouser Price/Stock: https://www.mouser.com/Search/Refine.aspx?Keyword=595-XTR105UA; RS Part Number: 2521672; RS Price/Stock: http://uk.rs-online.com/web/p/products/2521672
footprint SOIC14_1.27
pins: 1 I_R1, 2 V_-IN, 3 RG_1, 4 RG_2, 5 NC, 6 I_RET, 7 IO, 8 E_(EMITTER), 9 B_(BASE), 10 V+, 11 V_REG, 12 V_LINE, 13 V_+IN, 14 I_R2

## XTR111AIDGQR
designator U?
Integrated Circuit; Manufacturer_Name: Texas Instruments; Manufacturer_Part_Number: XTR111AIDGQR; Datasheet Link: http://www.ti.com/lit/gpn/xtr111; Height: 1.1mm; Mouser Part Number: 595-XTR111AIDGQR; Mouser Price/Stock: https://www.mouser.com/Search/Refine.aspx?Keyword=595-XTR111AIDGQR
footprint VSSOP10_0.5-PAD
pins: 1 VSP, 2 IS, 3 VG, 4 REGS, 5 REGF, 6 VIN, 7 SET, 8 ~{EF}, 9 OD, 10 GND, 11 PAD

## XTR111AIDRCT
designator U?
Integrated Circuit; Manufacturer_Name: Texas Instruments; Manufacturer_Part_Number: XTR111AIDRCT; Datasheet Link: http://www.ti.com/lit/gpn/xtr111; Mouser Part Number: 595-XTR111AIDRCT; Mouser Price/Stock: https://www.mouser.com/Search/Refine.aspx?Keyword=595-XTR111AIDRCT; RS Part Number: 1219141; RS Price/Stock: http://uk.rs-online.com/web/p/products/1219141
footprint DFN10_0.5-PAD(3X3)
pins: 1 VSP, 2 IS, 3 VG, 4 REGS, 5 REGF, 6 VIN, 7 SET, 8 EF, 9 OD, 10 GND, 11 PAD

## XTR115U_2K5
designator U?
Integrated Circuit; Manufacturer_Name: Texas Instruments; Manufacturer_Part_Number: XTR115U/2K5; Datasheet Link: http://www.ti.com/lit/ds/symlink/xtr115.pdf; Height: 1.75mm; Mouser Part Number: 595-XTR115U/2K5; Mouser Price/Stock: https://www.mouser.com/Search/Refine.aspx?Keyword=595-XTR115U%2F2K5
footprint SOIC8_1.27 (SOP, 8-Leads, Pitch 1.27mm)
pins: 1 VREF (in), 2 I_IN (in), 3 I_RET, 4 I_O, 5 EMITTER, 6 BASE, 7 V+, 8 VREG

## XTR116U
designator U?
Integrated Circuit; Manufacturer_Name: Texas Instruments; Manufacturer_Part_Number: XTR116U; Datasheet Link: http://www.ti.com/lit/ds/symlink/xtr116.pdf; Height: 1.75mm; Mouser Part Number: 595-XTR116U; Mouser Price/Stock: https://www.mouser.com/Search/Refine.aspx?Keyword=595-XTR116U; RS Part Number: 1457533; RS Price/Stock: http://uk.rs-online.com/web/p/products/1457533
footprint SOIC8_1.27 (SOP, 8-Leads, Pitch 1.27mm)
pins: 1 VREF (in), 2 I_IN (in), 3 I_RET, 4 I_O, 5 EMITTER, 6 BASE, 7 V+, 8 VREG